# Altium footprint library CUSTOM PCB.PcbLib: 404 footprints (part 23 of 26)
Each footprint in its own frame and in the unit in brackets; x right, y up, seen from the top. Pads: shape width x height; smd on the part's side, far side on the other; paste and mask are expansions set on the pad; w line width, h text height; cw(c..) or ccw(c..) is an arc to the next point about the centre after c.
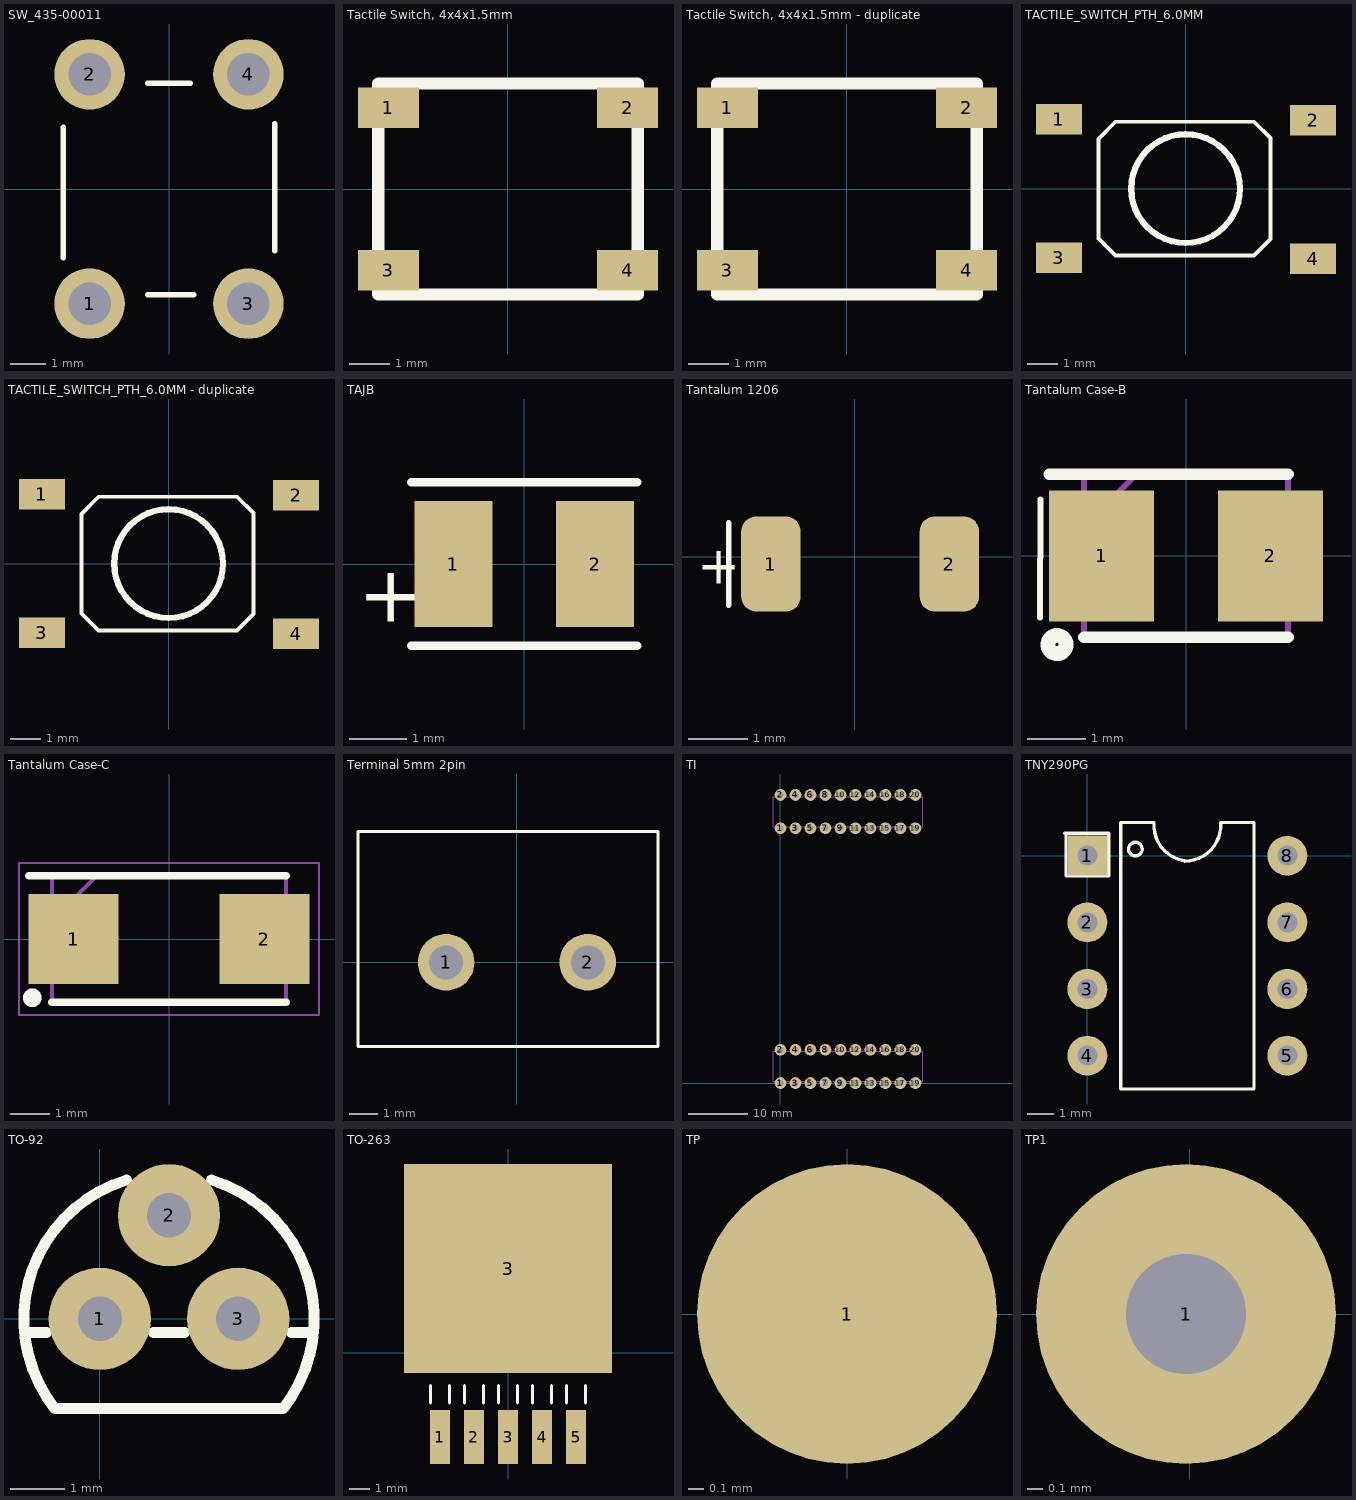
[diagram p22: the footprints below, top view; thin cyan lines are the x and y axes]

## SW_435-00011 [mm]
pads (4):
  round 2 hole 1.2: 1(-2.25,-3.25) 2(-2.25,3.25) 3(2.25,-3.25) 4(2.25,3.25)
Top Overlay:
  lines w0.15: -2.995,-1.95 -2.995,1.75 ; -0.6,-2.995 0.7,-2.995 ; -0.6,2.995 0.6,2.995 ; 2.995,-1.75 2.995,1.85
3D body "tactileswitch-short.STEP": height 4.95, standoff -3.38, extent -3.004,-3.846 3.003,3.846

## Tactile Switch, 4x4x1.5mm [mm]
pads (4):
  rect 1.5x1 smd: 1(-2.95,2) 2(2.95,2) 3(-2.95,-2) 4(2.95,-2)
Top Overlay:
  lines w0.3: -3.2,-2.6 -3.2,2.6 3.2,2.6 3.2,-2.6 -3.2,-2.6
3D body "User Library-4x4_SMD_Switch.x_t": height 1.5, standoff 0, extent -3.2,-2.6 3.2,2.6

## Tactile Switch, 4x4x1.5mm - duplicate [mm]
pads (4):
  rect 1.5x1 smd: 1(-2.95,2) 2(2.95,2) 3(-2.95,-2) 4(2.95,-2)
Top Overlay:
  lines w0.3: -3.2,-2.6 -3.2,2.6 3.2,2.6 3.2,-2.6 -3.2,-2.6

## TACTILE_SWITCH_PTH_6.0MM [mm] "TACTILE_SWITCH_PTH_6.0MM"
pads (4):
  rect 1.5x1 smd: 1(-4.14,2.261) 2(4.166,2.235) 3(-4.14,-2.261) 4(4.166,-2.286)
Top Overlay:
  circle w0.203: c0,0 r1.778
  lines w0.127: -2.845,-1.626 -2.286,-2.184 2.235,-2.184 2.769,-1.651 2.769,1.651 2.235,2.184 -2.286,2.184 -2.845,1.626 -2.845,-1.626
3D body "User Library-PTS645SL43SMTR92-LFS.STEP": height 4.3, standoff 0, extent -4.475,-3.025 4.525,2.975

## TACTILE_SWITCH_PTH_6.0MM - duplicate [mm] "TACTILE_SWITCH_PTH_6.0MM"
pads (4):
  rect 1.5x1 smd: 1(-4.14,2.261) 2(4.166,2.235) 3(-4.14,-2.261) 4(4.166,-2.286)
Top Overlay:
  circle w0.203: c0,0 r1.778
  lines w0.127: -2.845,-1.626 -2.286,-2.184 2.235,-2.184 2.769,-1.651 2.769,1.651 2.235,2.184 -2.286,2.184 -2.845,1.626 -2.845,-1.626
3D body "User Library-PTS645SL43SMTR92-LFS.STEP": height 4.3, standoff 0, extent -4.475,-3.025 4.525,2.975

## TAJB [mil]
pads (2):
  rect 54x87 smd paste+0 mask+0: 1(-49,0) 2(49,0)
Top Overlay:
  lines w6: -78,-56.45 78,-56.45 ; -78,56.45 78,56.45
  text "+" at -115,-40 h39.37
3D body "TAJB.step": height 85, standoff 0, extent -72.99,-59.01 72.99,59.01
3D body "TAJB-M.step": height 82.01, standoff -2.99, extent -72.99,-59.01 72.99,59.01

## Tantalum 1206 [mm]
pads (2):
  rrect50% 1x1.6 smd: 1(-1.407,-0.119) 2(1.593,-0.119)
Top Overlay:
  lines w0.1: -2.117,-0.805 -2.117,0.567
  text "+" at -2.65,-0.449 h0.64
3D body "C-1206.STEP": height 1, standoff 0, extent -1.507,-0.919 1.693,0.681

## Tantalum Case-B [mm]
pads (2):
  rect 1.8x2.25 smd: 1(-1.45,0) 2(1.45,0)
Top Overlay:
  circle w0.254: c-2.215,-1.524 r0.156
  lines w0.1: -2.504,-1.062 -2.497,0.973
  lines w0.2: -2.35,1.4 1.75,1.4 ; -1.75,-1.4 1.75,-1.4
Mechanical 15:
  lines w0.1: -1.75,0.5 -0.85,1.4 ; -1.75,-1.4 1.75,-1.4 1.75,1.4 -1.75,1.4 -1.75,-1.4
3D body "293D106X0010B2TE3.stp": height 2.1, standoff 0, extent -1.758,-1.351 1.742,1.449

## Tantalum Case-C [mm]
pads (2):
  rrect0% 2.3x2.3 smd: 1(-2.45,0) 2(2.45,0)
Top Overlay:
  circle w0.254: c-3.508,-1.509 r0.113
  lines w0.2: -3.6,1.625 3,1.625 ; -3,-1.625 3,-1.625
Mechanical 15:
  lines w0.1: -3,0.475 -1.85,1.625 ; -3,-1.625 -3,1.625 3,1.625 3,-1.625 -3,-1.625
Mechanical 20:
  lines w0.05: -3.85,-1.95 -3.85,1.95 3.85,1.95 3.85,-1.95 -3.85,-1.95

## Terminal 5mm 2pin [mm]
pads (2):
  round 2 hole 1.2: 1(-2.5,0) 2(2.5,0)
Top Overlay:
  lines w0.1: -5.613,-2.98 4.98,-2.98 4.98,4.623 -5.613,4.623 -5.613,-2.98
3D body "User Library-Terminal-Screw-3A-2way.x_b": height 10, standoff -3, extent -5.618,-2.98 4.982,4.62

## TI [mm]
pads (40):
  round 2 hole 1: 1(0,0) 1(0,43.18) 2(0,5.65) 2(0,48.83) 3(2.54,0) 3(2.54,43.18) 4(2.54,5.65) 4(2.54,48.83) 5(5.08,0) 5(5.08,43.18) 6(5.08,5.65) 6(5.08,48.83) 7(7.62,0) 7(7.62,43.18) 8(7.62,5.65) 8(7.62,48.83) 9(10.16,0) 9(10.16,43.18) 10(10.16,5.65) 10(10.16,48.83) 11(12.7,0) 11(12.7,43.18) 12(12.7,5.65) 12(12.7,48.83) 13(15.24,0) 13(15.24,43.18) 14(15.24,5.65) 14(15.24,48.83) 15(17.78,0) 15(17.78,43.18) 16(17.78,5.65) 16(17.78,48.83) 17(20.32,0) 17(20.32,43.18) 18(20.32,5.65) 18(20.32,48.83) 19(22.86,0) 19(22.86,43.18) 20(22.86,5.65) 20(22.86,48.83)
Bottom Overlay:
  rectangle: -1.595,0.6 -1.245,1.2
  rectangle: -1.595,43.78 -1.245,44.38
  lines w0.2: -0.91,0.285 -1.27,0.285 -1.27,5.365 -0.91,5.365 ; -0.91,43.465 -1.27,43.465 -1.27,48.545 -0.91,48.545 ; 23.77,0.285 24.13,0.285 24.13,5.365 23.77,5.365 ; 23.77,43.465 24.13,43.465 24.13,48.545 23.77,48.545
Mechanical 6:
  lines w0.1: -0.254,0.285 -0.254,-0.693 0.254,-0.693 0.254,0.285 ; -0.254,5.365 -0.254,6.343 0.254,6.343 0.254,5.365 ; -0.254,43.465 -0.254,42.487 0.254,42.487 0.254,43.465 ; -0.254,48.545 -0.254,49.523 0.254,49.523 0.254,48.545 ; 2.286,0.285 2.286,-0.693 2.794,-0.693 2.794,0.285 ; 2.286,5.365 2.286,6.343 2.794,6.343 2.794,5.365 ; 2.286,43.465 2.286,42.487 2.794,42.487 2.794,43.465 ; 2.286,48.545 2.286,49.523 2.794,49.523 2.794,48.545 ; 4.826,0.285 4.826,-0.693 5.334,-0.693 5.334,0.285 ; 4.826,5.365 4.826,6.343 5.334,6.343 5.334,5.365 ; 4.826,43.465 4.826,42.487 5.334,42.487 5.334,43.465 ; 4.826,48.545 4.826,49.523 5.334,49.523 5.334,48.545 ; 7.366,0.285 7.366,-0.693 7.874,-0.693 7.874,0.285 ; 7.366,5.365 7.366,6.343 7.874,6.343 7.874,5.365 ; 7.366,43.465 7.366,42.487 7.874,42.487 7.874,43.465 ; 7.366,48.545 7.366,49.523 7.874,49.523 7.874,48.545 ; 9.906,0.285 9.906,-0.693 10.414,-0.693 10.414,0.285 ; 9.906,5.365 9.906,6.343 10.414,6.343 10.414,5.365 ; 9.906,43.465 9.906,42.487 10.414,42.487 10.414,43.465 ; 9.906,48.545 9.906,49.523 10.414,49.523 10.414,48.545 ; 12.446,0.285 12.446,-0.693 12.954,-0.693 12.954,0.285 ; 12.446,5.365 12.446,6.343 12.954,6.343 12.954,5.365 ; 12.446,43.465 12.446,42.487 12.954,42.487 12.954,43.465 ; 12.446,48.545 12.446,49.523 12.954,49.523 12.954,48.545 ; 14.986,0.285 14.986,-0.693 15.494,-0.693 15.494,0.285 ; 14.986,5.365 14.986,6.343 15.494,6.343 15.494,5.365 ; 14.986,43.465 14.986,42.487 15.494,42.487 15.494,43.465 ; 14.986,48.545 14.986,49.523 15.494,49.523 15.494,48.545 ; 17.526,0.285 17.526,-0.693 18.034,-0.693 18.034,0.285 ; 17.526,5.365 17.526,6.343 18.034,6.343 18.034,5.365 ; 17.526,43.465 17.526,42.487 18.034,42.487 18.034,43.465 ; 17.526,48.545 17.526,49.523 18.034,49.523 18.034,48.545 ; 20.066,0.285 20.066,-0.693 20.574,-0.693 20.574,0.285 ; 20.066,5.365 20.066,6.343 20.574,6.343 20.574,5.365 ; 20.066,43.465 20.066,42.487 20.574,42.487 20.574,43.465 ; 20.066,48.545 20.066,49.523 20.574,49.523 20.574,48.545 ; 22.606,0.285 22.606,-0.693 23.114,-0.693 23.114,0.285 ; 22.606,5.365 22.606,6.343 23.114,6.343 23.114,5.365 ; 22.606,43.465 22.606,42.487 23.114,42.487 23.114,43.465 ; 22.606,48.545 22.606,49.523 23.114,49.523 23.114,48.545 ; -1.27,0.285 -1.27,5.365 24.13,5.365 24.13,0.285 -1.27,0.285 ; -1.27,43.465 -1.27,48.545 24.13,48.545 24.13,43.465 -1.27,43.465
  text ".Designator" at 11.248,2.797 h1.02
  text ".Designator" at 11.248,45.977 h1.02
3D body "SSM-110-S-DV.stp": height 7.42, standoff 0, extent -1.27,-0.693 24.13,6.343
3D body "SSM-110-S-DV.stp": height 7.42, standoff 0, extent -1.27,42.487 24.13,49.523

## TNY290PG [mil] "AC/DC Converters 28.5 W (85-265 VAC) 36.5 W (230 VAC)"
pads (8):
  rect 60x60 hole 30: 1(0,0)
  round 60 hole 30: 2(0,-100) 3(0,-200) 4(0,-300) 5(300,-300) 6(300,-200) 7(300,-100) 8(300,0)
Top Overlay:
  lines w5: -34,34 -32,34 ; 77.25,18.74 ccw(c72,10) 79.21,17.21 ; 146,-8.15 ccw(c146,46) 200,50 250,50 250,-350 50,-350 50,50 100,50 ccw(c154,46) 150,-8 ; -32,34 -32,-30 32,-30 32,34 -32,34
3D body "DIP8N.STEP": height 161.07, standoff -108.61, extent -17.23,-337.01 318.48,37.01

## TO-92 [mil] "Tapped"
pads (3):
  round 74 hole 32: 1(0,0) 2(50,75) 3(100,0)
Top Overlay:
  lines w8: -54.52,-10 -38.73,-10 ; -32.74,-64.65 cw(c50,0) 19.3,100.41 ; -32.46,-65 132.46,-65 ; 38.73,-10 61.27,-10 ; 80.7,100.41 cw(c50,0) 132.74,-64.64 ; 138.73,-10 154.52,-10
3D body "SW3DPS-TO-92A-DEFAULT.STEP": height 157.48, standoff -134.25, extent -40,-40 140,90

## TO-263 [mil]
pads (6):
  rect 40x106 smd: 1(-134,-166) 2(-67,-166) 3(0,-166) 4(67,-166) 5(134,-166)
  rect 410x412 smd: 3(0,166)
Top Overlay:
  lines w6: -153,-99 -153,-64 ; -115,-99 -115,-64 ; -86,-99 -86,-64 ; -48,-99 -48,-64 ; -19,-99 -19,-64 ; 19,-99 19,-64 ; 48,-99 48,-64 ; 86,-99 86,-64 ; 115,-99 115,-64 ; 153,-99 153,-64
3D body "TS5B.SLDPRT": height 180.31, standoff 0, extent -200.79,-182.48 200,382.48

## TP [mm] "Tp"
pads (1):
  round 2 smd: 1(0,0)

## TP1 [mm] "Test Point"
pads (1):
  round 2 hole 0.8: 1(-0.025,0)